# Altium footprint library BARKO_PCBLIB.PcbLib: 531 footprints (part 12 of 34)
Each footprint in its own frame and in the unit in brackets; x right, y up, seen from the top. Pads: shape width x height; smd on the part's side, far side on the other; paste and mask are expansions set on the pad; w line width, h text height; cw(c..) or ccw(c..) is an arc to the next point about the centre after c.
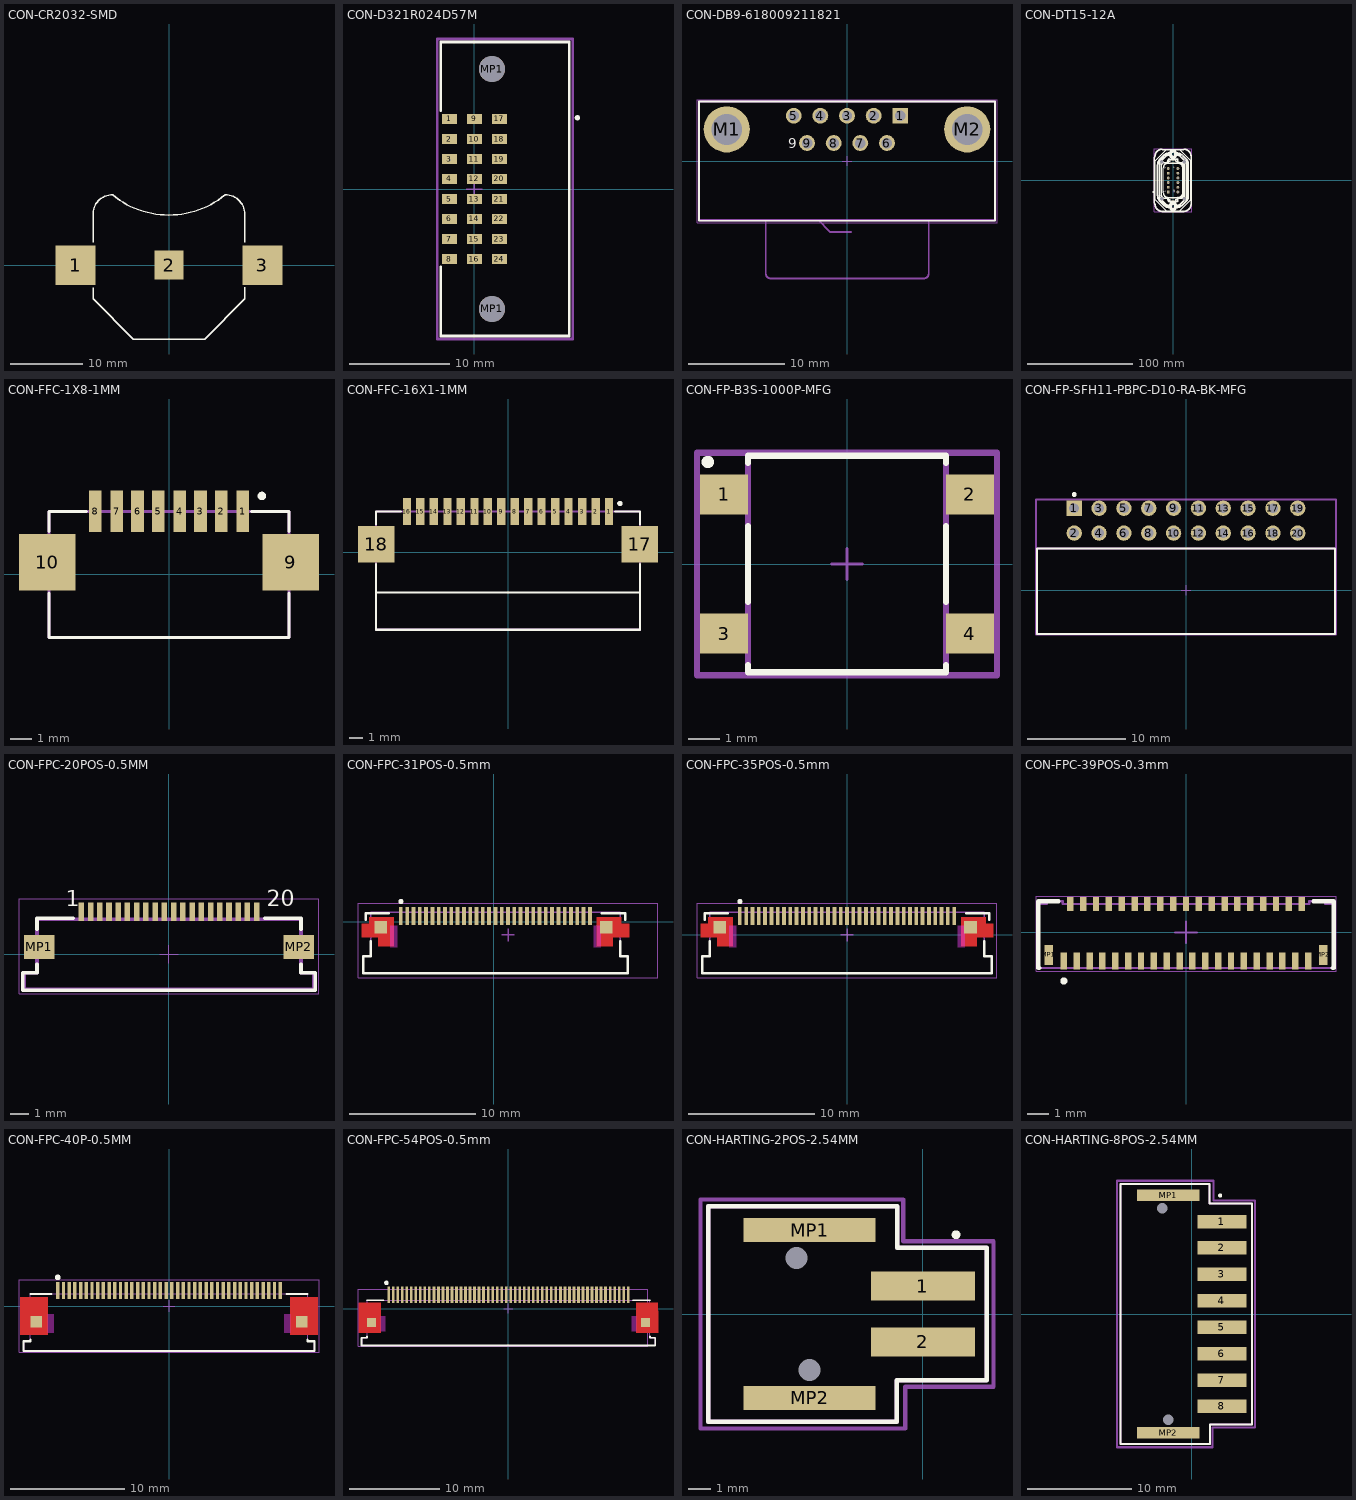
[diagram p11: the footprints below, top view; thin cyan lines are the x and y axes]

## CON-CR2032-SMD [mm] "COIN HOLDER"
pads (3):
  rect 5.5x5.5 smd: 1(-13,0) 3(13,0)
  rect 4x4 smd: 2(0,0)
Top Overlay:
  lines w0.2: -10.541,3.17 -10.541,7.272 -10.54,7.273 -10.54,7.255 ; -10.541,7.239 cw(c-7.925,7.162) -7.848,9.779 ccw(c-0.024,19.196) 7.8,9.779 cw(c7.822,7.06) 10.541,7.081 ; -10.54,-3.12 -10.541,-3.119 -10.541,-3.121 -10.541,-4.712 -4.978,-10.275 4.978,-10.275 10.541,-4.712 10.541,-3.101 ; 10.541,3.201 10.541,7.185
ASM Top:
  text ".designator" at -2,0.003 h0.8
3D body "User Library-3002.step": height 3.98, standoff 0.01, extent -15.367,-10.274 15.367,9.779

## CON-D321R024D57M [mm]
pads (26):
  rect 1.5x1 smd mask+0.05: 1(-2.5,7) 2(-2.5,5) 3(-2.5,3) 4(-2.5,1) 5(-2.5,-1) 6(-2.5,-3) 7(-2.5,-5) 8(-2.5,-7) 9(0,7) 10(0,5) 11(0,3) 12(0,1) 13(0,-1) 14(0,-3) 15(0,-5) 16(0,-7) 17(2.5,7) 18(2.5,5) 19(2.5,3) 20(2.5,1) 21(2.5,-1) 22(2.5,-3) 23(2.5,-5) 24(2.5,-7)
  round 2.6 hole 2.6 unplated: MP1(1.75,-12) MP1(1.75,12)
Top Overlay:
  circle w0.3: c10.3,7.125 r0.12
  lines w0.254: -3.375,-7.8 -3.375,-14.7 9.475,-14.7 9.475,14.7 -3.375,14.7 -3.375,7.85
Mechanical 15:
  lines w0.15: -0.8,0 0,0 ; 0,-0.8 0,0 ; 0,0.8 0,0 ; 0.8,0 0,0
  lines w0.254: -3.7,-15 9.85,-15 9.85,15 -3.7,15 -3.7,-15
3D body "D321R024D57M.STEP": height 8.6, standoff -6.55, extent -3.184,-14.5 9.29,14.5

## CON-DB9-618009211821 [mm] "09p 8.08mm bracket, board lock & UNC4-40 Rivet without hex screw"
height 12.5
pads (11):
  rect 1.65x1.65 hole 1.09: 1(5.54,4.72)
  round 1.65 hole 1.09: 2(2.77,4.72) 3(0,4.72) 4(-2.77,4.72) 5(-5.54,4.72) 6(4.155,1.88) 7(1.385,1.88) 8(-1.385,1.88) 9(-4.155,1.88)
  round 4.8 hole 3.2: M1(-12.5,3.3) M2(12.5,3.3)
Top Overlay:
  lines w0.2: -15.4,-6.2 -15.4,6.2 15.4,6.2 15.4,-6.2 -15.4,-6.2
  text "9" at -6.1,1.35 h1.02
Dimensions:
  lines w0.2: -15.4,-6.12 15.4,-6.12 ; -3,-6.12 -1.77,-7.35 0.4,-7.35
  text "PCB Edge" at 0.7,-8.05 h1.02
Mechanical 15:
  lines w0.05: -0.5,0 0.5,0 ; 0,-0.5 0,0.5 ; -15.6,-6.4 15.6,-6.4 15.6,6.4 -15.6,6.4 -15.6,-6.4
ASM Top:
  lines w0.2: -8.45,-6.2 -8.45,-11.7 ccw(c-7.95,-11.7) -7.95,-12.2 ; -8,-12.2 8,-12.2 ccw(c8,-11.7) 8.5,-11.7 8.5,-6.2 ; -15.4,-6.2 -15.4,6.2 15.4,6.2 15.4,-6.2 -15.4,-6.2
  text ".designator" at 0,0.115 h0.8
3D body "618009211821.stp": height 12.55, standoff -3.95, extent -15.4,-12.2 15.4,6.2

## CON-DT15-12A [mm] "12 Position 4.44mm"
height 3.12
pads (16):
  rect 2.7x2.7 hole 1.77: 1(-4.56,-11.115)
  round 2.7 hole 1.77: 2(-4.56,-6.67) 3(-4.56,-2.225) 4(-4.56,2.225) 5(-4.56,6.67) 6(-4.56,11.115) 7(4.56,11.115) 8(4.56,6.67) 9(4.56,2.225) 10(4.56,-2.225) 11(4.56,-6.67) 12(4.56,-11.115)
  round 3 hole 3 unplated: ""(-10.67,-17.545) ""(-10.67,17.535) ""(10.67,-17.545) ""(10.67,17.535)
Top Overlay:
  drawing of 420 lines, arcs and shapes, not listed
  text "7" at 2.7,11.2 h2
  text "6" at -6.6,11 h2
  text "1" at -6.5,-11.3 h2
  text "12" at 2.7,-11.6 h2
Mechanical 15:
  lines w0.2: -17.9,-29.9 -17.9,29.9 17.9,29.9 17.9,-29.9 -17.9,-29.9
ASM Top:
  lines w0.2: -17.627,-21.986 ccw(c-10.007,-21.986) -10.007,-29.606 10.008,-29.606 ccw(c10.008,-21.986) 17.628,-21.986 17.628,21.981 ccw(c10.008,21.981) 10.008,29.601 -10.007,29.601 ccw(c-10.007,21.981) -17.627,21.981 -17.627,-21.986
  text ".designator" at -1.5,-0.2 h0.8
3D body "c-dt15-12pa-e-3d.stp": height 30.14, standoff -3.09, extent -17.628,-29.604 17.628,29.604

## CON-FFC-1X8-1MM [mil]
pads (10):
  rect 24x78 smd mask+2: 1(138,118) 2(98,118) 3(59,118) 4(20,118) 5(-20,118) 6(-59,118) 7(-98,118) 8(-138,118)
  rect 106x106 smd mask+2: 9(228,23) 10(-228,23)
Top Overlay:
  circle w7.87: c174,147 r3.94
  lines w6: -225,-35 -225,-118 225,-118 225,-35 ; -225,81 -225,118 -155,118 ; 155,118 225,118 225,81
ASM Top:
  lines w6: -225,-118 -225,118 225,118 225,-118 -225,-118
  text ".designator" at -209,-65 h31.5
3D body "8 way 1mm.stp": height 81.37, standoff -1.48, extent -248.1,-110 247.99,141.97

## CON-FFC-16X1-1MM [mil]
pads (18):
  rect 24x78 smd mask+2: 1(295,118) 2(256,118) 3(217,118) 4(177,118) 5(138,118) 6(98,118) 7(59,118) 8(20,118) 9(-20,118) 10(-59,118) 11(-98,118) 12(-138,118) 13(-177,118) 14(-217,118) 15(-256,118) 16(-295,118)
  rect 106x106 smd mask+2: 17(385,23) 18(-385,23)
Top Overlay:
  circle w7.87: c326.77,141.73 r3.94
  lines w6: -385,-118 385,-118 ; -385,-35 -385,-227 385,-227 385,-35 ; -385,81 -385,118 -312,118 ; 312,118 385,118 385,81
ASM Top:
  lines w6: -385,-227 -385,118 385,118 385,-227 -385,-227
  text ".designator" at -295,-27 h31.5
3D body "16 way 1mm.stp": height 81.48, standoff -1.48, extent -406.06,-115 405,136.97

## CON-FP-B3S-1000P-MFG [mm]
pads (4):
  rect 1.55x1.3 smd paste+0 mask+0: 1(-3.975,2.25) 2(3.975,2.25) 3(-3.975,-2.25) 4(3.975,-2.25)
Top Overlay:
  circle w0.2: c-4.5,3.3 r0.1
  lines w0.2: -3.2,-3.275 -3.2,-3.5 3.2,-3.5 3.2,-3.275 ; -3.2,-1.225 -3.2,1.225 ; -3.2,3.275 -3.2,3.5 3.2,3.5 3.2,3.275 ; 3.2,-1.225 3.2,1.225
Mechanical 15:
  lines w0.1: -0.5,0 0.5,0 ; 0,-0.5 0,0.5 ; -4.85,-3.6 4.85,-3.6 4.85,3.6 -4.85,3.6 -4.85,-3.6
ASM Top:
  lines w0.2: -4.85,-3.6 4.85,-3.6 4.85,3.6 -4.85,3.6 -4.85,-3.6 ; -3.2,-3.5 3.2,-3.5 3.2,3.5 -3.2,3.5 -3.2,-3.5
  text ".designator" at 0,0.188 h1
3D body "Switch_Omron_Electronics_Inc-EMC_Div_B3S-1000P_eec.STEP": height 4.7, standoff 0, extent -4.5,-3.3 4.5,3.3

## CON-FP-SFH11-PBPC-D10-RA-BK-MFG [mm]
pads (20):
  rect 1.57x1.57 hole 1.02 paste-1000 mask+0: 1(-11.43,8.39)
  round 1.57 hole 1.02 paste-1000 mask+0: 2(-11.43,5.85) 3(-8.89,8.39) 4(-8.89,5.85) 5(-6.35,8.39) 6(-6.35,5.85) 7(-3.81,8.39) 8(-3.81,5.85) 9(-1.27,8.39) 10(-1.27,5.85) 11(1.27,8.39) 12(1.27,5.85) 13(3.81,8.39) 14(3.81,5.85) 15(6.35,8.39) 16(6.35,5.85) 17(8.89,8.39) 18(8.89,5.85) 19(11.43,8.39) 20(11.43,5.85)
Top Overlay:
  circle w0.25: c-11.43,9.8 r0.125
  lines w0.2: -15.24,-4.45 -15.24,4.25 15.24,4.25 15.24,-4.45 -15.24,-4.45
Mechanical 13:
  lines w0.2: -15.24,-4.45 -15.24,4.25 15.24,4.25 15.24,-4.45 -15.24,-4.45
Mechanical 15:
  lines w0.1: -0.5,0 0.5,0 ; 0,-0.5 0,0.5
  lines w0.2: -15.34,-4.55 -15.34,9.275 15.34,9.275 15.34,-4.55 -15.34,-4.55
ASM Top:
  lines w0.2: -15.34,-4.55 -15.34,9.275 15.34,9.275 15.34,-4.55 -15.34,-4.55
  text ".designator" at 0,2.551 h1
3D body "Conn_Sullins_SFH11-PBPC-D10-RA-BK_eec.STEP": height 7.11, standoff -2.68, extent -15.128,-4.247 15.192,8.593

## CON-FPC-20POS-0.5MM [mm] "ZIF Connectors, Horizontal, Top Contact Low Profile, pitch 0.5mm, 20p"
height 1.3
pads (22):
  rect 0.3x1 smd: 1(-4.75,2.3) 2(-4.25,2.3) 3(-3.75,2.3) 4(-3.25,2.3) 5(-2.75,2.3) 6(-2.25,2.3) 7(-1.75,2.3) 8(-1.25,2.3) 9(-0.75,2.3) 10(-0.25,2.3) 11(0.25,2.3) 12(0.75,2.3) 13(1.25,2.3) 14(1.75,2.3) 15(2.25,2.3) 16(2.75,2.3) 17(3.25,2.3) 18(3.75,2.3) 19(4.25,2.3) 20(4.75,2.3)
  rect 1.65x1.3 smd: MP1(-7.025,0.4) MP2(7.025,0.4)
Top Overlay:
  lines w0.2: -7.15,-0.55 -7.15,-1 -7.925,-1 -7.925,-1.95 7.925,-1.95 7.925,-1 7.15,-1 7.15,-0.55 ; -7.15,1.35 -7.15,1.95 -5.2,1.95 ; 5.2,1.95 7.15,1.95 7.15,1.35
  text "20" at 5.3,2.3 h1.5
  text "1" at -5.6,2.3 h1.5
Mechanical 15:
  lines w0.05: -0.5,0 0.5,0 ; 0,-0.5 0,0.5 ; -8.125,-2.15 8.125,-2.15 8.125,3 -8.125,3 -8.125,-2.15
ASM Top:
  lines w0.2: -7.85,-1.9 -7.85,-1 -7.15,-1 -7.15,1.9 7.15,1.9 7.15,-1 7.85,-1 7.85,-1.9 -7.85,-1.9
  text ".designator" at -0.6,0 h0.8
3D body "687120183622.stp": height 1.28, standoff -0.01, extent -7.85,-1.9 7.85,2.35

## CON-FPC-31POS-0.5mm [mm] "FPC Connector, 31-Leads, Right Angle, Pitch 0.5 mm, Mated Height 2.0 mm, SMT"
height 1.9
pads (33):
  rect 0.3x1.4 smd: 1(-7.35,0.45) 2(-6.85,0.45) 3(-6.35,0.45) 4(-5.85,0.45) 5(-5.35,0.45) 6(-4.85,0.45) 7(-4.35,0.45) 8(-3.85,0.45) 9(-3.35,0.45) 10(-2.85,0.45) 11(-2.35,0.45) 12(-1.85,0.45) 13(-1.35,0.45) 14(-0.85,0.45) 15(-0.35,0.45) 16(0.15,0.45) 17(0.65,0.45) 18(1.15,0.45) 19(1.65,0.45) 20(2.15,0.45) 21(2.65,0.45) 22(3.15,0.45) 23(3.65,0.45) 24(4.15,0.45) 25(4.65,0.45) 26(5.15,0.45) 27(5.65,0.45) 28(6.15,0.45) 29(6.65,0.45) 30(7.15,0.45) 31(7.65,0.45)
  rect 1x1 smd: MP1(-8.95,-0.45) MP2(8.95,-0.45)
Top Layer:
  region: -7.9,-1.95 -9.15,-1.95 -9.15,-1.25 -10.45,-1.25 -10.45,-0.15 -9.85,-0.15 -9.85,0.35 -7.9,0.35
  region: 8.2,-1.95 9.45,-1.95 9.45,-1.25 10.75,-1.25 10.75,-0.15 10.15,-0.15 10.15,0.35 8.2,0.35
Top Overlay:
  circle w0.2: c-7.35,1.6 r0.1
  lines w0.2: -10.15,0.15 -10.15,0.65 -8.3,0.65 ; -9.75,-1.55 -9.75,-2.75 -10.35,-2.75 -10.35,-4.1 10.65,-4.1 10.65,-2.75 10.05,-2.75 10.05,-1.55 ; 8.599,0.65 10.449,0.65 10.449,0.15
Keep-Out Layer:
  region: -7.65,-0.339 -8.2,-0.339 -8.2,-2.039 -7.65,-2.039
  region: 8.493,-0.339 7.943,-0.339 7.943,-2.039 8.493,-2.039
Mechanical 15:
  lines w0.05: -10.75,-4.45 13.05,-4.45 13.05,1.45 -10.75,1.45 -10.75,-4.45
  lines w0.1: 0.65,-1.05 1.65,-1.05 ; 1.15,-1.55 1.15,-0.55
ASM Top:
  lines w0.1: -10.35,-4.05 -10.35,-2.75 -9.75,-2.75 -9.75,0.728 10.05,0.728 10.05,-2.75 10.65,-2.75 10.65,-4.05 -10.35,-4.05
  text ".designator" at -1.15,-1.55 h0.8
3D body "ssfv31r_4stlf.stp": height 1.88, standoff 0.01, extent -10.35,-4.15 10.65,0.75

## CON-FPC-35POS-0.5mm [mm] "FPC Connector, 35-Leads, Right Angle, Pitch 0.5 mm, Mated Height 2.0 mm, SMT"
height 1.9
pads (37):
  rect 0.3x1.4 smd: 1(-8.5,1.5) 2(-8,1.5) 3(-7.5,1.5) 4(-7,1.5) 5(-6.5,1.5) 6(-6,1.5) 7(-5.5,1.5) 8(-5,1.5) 9(-4.5,1.5) 10(-4,1.5) 11(-3.5,1.5) 12(-3,1.5) 13(-2.5,1.5) 14(-2,1.5) 15(-1.5,1.5) 16(-1,1.5) 17(-0.5,1.5) 18(0,1.5) 19(0.5,1.5) 20(1,1.5) 21(1.5,1.5) 22(2,1.5) 23(2.5,1.5) 24(3,1.5) 25(3.5,1.5) 26(4,1.5) 27(4.5,1.5) 28(5,1.5) 29(5.5,1.5) 30(6,1.5) 31(6.5,1.5) 32(7,1.5) 33(7.5,1.5) 34(8,1.5) 35(8.5,1.5)
  rect 1x1 smd: MP1(-10.1,0.6) MP2(9.8,0.6)
Top Layer:
  region: -9.05,-0.9 -10.3,-0.9 -10.3,-0.2 -11.6,-0.2 -11.6,0.9 -11,0.9 -11,1.4 -9.05,1.4
  region: 9.05,-0.9 10.3,-0.9 10.3,-0.2 11.6,-0.2 11.6,0.9 11,0.9 11,1.4 9.05,1.4
Top Overlay:
  circle w0.2: c-8.5,2.65 r0.1
  lines w0.2: -11.5,-3.05 11.5,-3.05 11.5,-1.7 10.9,-1.7 10.9,-0.5 ; -11.5,-3.05 -11.5,-1.7 -10.9,-1.7 -10.9,-0.5 ; -11.3,1.2 -11.3,1.7 -9.45,1.7 ; 9.45,1.7 11.3,1.7 11.3,1.2
Keep-Out Layer:
  region: 9.343,0.711 8.793,0.711 8.793,-0.989 9.343,-0.989
  region: -8.8,0.711 -9.35,0.711 -9.35,-0.989 -8.8,-0.989
Mechanical 15:
  lines w0.05: -11.9,-3.4 11.9,-3.4 11.9,2.5 -11.9,2.5 -11.9,-3.4
  lines w0.1: -0.5,0 0.5,0 ; 0,-0.5 0,0.5
ASM Top:
  lines w0.1: -11.5,-3 -11.5,-1.7 -10.9,-1.7 -10.9,1.778 10.9,1.778 10.9,-1.7 11.5,-1.7 11.5,-3 -11.5,-3
  text ".designator" at -0.6,-0.2 h0.8
3D body "ssfv35r_2stlf.stp": height 1.88, standoff 0.01, extent -11.5,-3.122 11.5,1.778

## CON-FPC-39POS-0.3mm [mm] "FPC Connector, 39-Leads, Right Angle, Pitch 0.3 mm, Mated Height 0.9 mm, SMT"
height 0.912
pads (41):
  rect 0.3x0.8 smd mask+0.05: 1(-5.7,-1.325) 3(-5.1,-1.325) 5(-4.5,-1.325) 7(-3.9,-1.325) 9(-3.3,-1.325) 11(-2.7,-1.325) 13(-2.1,-1.325) 15(-1.5,-1.325) 17(-0.9,-1.325) 19(-0.3,-1.325) 21(0.3,-1.325) 23(0.9,-1.325) 25(1.5,-1.325) 27(2.1,-1.325) 29(2.7,-1.325) 31(3.3,-1.325) 33(3.9,-1.325) 35(4.5,-1.325) 37(5.1,-1.325) 39(5.7,-1.325)
  rect 0.3x0.65 smd mask+0.05: 2(-5.4,1.325) 4(-4.8,1.325) 6(-4.2,1.325) 8(-3.6,1.325) 10(-3,1.325) 12(-2.4,1.325) 14(-1.8,1.325) 16(-1.2,1.325) 18(-0.6,1.325) 20(0,1.325) 22(0.6,1.325) 24(1.2,1.325) 26(1.8,1.325) 28(2.4,1.325) 30(3,1.325) 32(3.6,1.325) 34(4.2,1.325) 36(4.8,1.325) 38(5.4,1.325)
  rect 0.4x0.95 smd mask+0.05: MP1(-6.4,-1.05) MP2(6.4,-1.05)
Top Overlay:
  circle w0.25: c-5.7,-2.26 r0.04
  lines w0.2: -6.85,-1.655 -6.9,-1.655 -6.9,1.455 -5.95,1.455 ; 5.95,1.455 6.9,1.455 6.9,-1.655 6.85,-1.655 ; -6.5,1.455 -6.5,1.455
Mechanical 15:
  lines w0.05: -7,-1.81 7,-1.81 7,1.69 -7,1.69 -7,-1.81
  lines w0.1: -0.5,0 0.5,0 ; 0,-0.5 0,0.5
ASM Top:
  lines w0.1: -6.9,-1.655 -6.6,-1.655 6.6,-1.655 6.9,-1.655 6.9,1.325 6.5,1.325 6.5,1.455 5.75,1.455 5.75,1.325 -5.75,1.325 -5.75,1.455 -6.5,1.455 -6.5,1.325 -6.9,1.325 -6.9,-1.655
  text ".designator" at 0,0 h1.2
3D body "s10061122-391420hlf.stp": height 0.91, standoff 0.01, extent -6.75,-1.925 6.75,1.575

## CON-FPC-40P-0.5MM [mm] "FPC Connector, 40-Leads, Right Angle, Pitch 0.5 mm, Mated Height 2.0 mm, SMT"
height 2.002
pads (42):
  rect 0.3x1.5 smd mask+0.05: 1(-9.75,1.375) 2(-9.25,1.375) 3(-8.75,1.375) 4(-8.25,1.375) 5(-7.75,1.375) 6(-7.25,1.375) 7(-6.75,1.375) 8(-6.25,1.375) 9(-5.75,1.375) 10(-5.25,1.375) 11(-4.75,1.375) 12(-4.25,1.375) 13(-3.75,1.375) 14(-3.25,1.375) 15(-2.75,1.375) 16(-2.25,1.375) 17(-1.75,1.375) 18(-1.25,1.375) 19(-0.75,1.375) 20(-0.25,1.375) 21(0.25,1.375) 22(0.75,1.375) 23(1.25,1.375) 24(1.75,1.375) 25(2.25,1.375) 26(2.75,1.375) 27(3.25,1.375) 28(3.75,1.375) 29(4.25,1.375) 30(4.75,1.375) 31(5.25,1.375) 32(5.75,1.375) 33(6.25,1.375) 34(6.75,1.375) 35(7.25,1.375) 36(7.75,1.375) 37(8.25,1.375) 38(8.75,1.375) 39(9.25,1.375) 40(9.75,1.375)
  rect 1x1 smd paste-10 mask+0.05: MP1(-11.65,-1.375) MP2(11.65,-1.375)
Top Layer:
  region: -10.65,0.8 -13.05,0.8 -13.05,-0.925 -13.05,-2.525 -10.65,-2.525
  region: 10.65,0.8 13.05,0.8 13.05,-0.925 13.05,-2.525 10.65,-2.525
Top Overlay:
  circle w0.25: c-9.75,2.525 r0.125
  lines w0.2: -12.15,-2.925 -12.15,-3.075 -12.75,-3.075 -12.75,-3.925 12.75,-3.925 12.75,-3.075 12.15,-3.075 12.15,-2.925 ; -12.15,1.075 -10.3,1.075 ; 10.3,1.075 12.15,1.075
Top Paste:
  region: 11.7,-1.1 10.9,-1.1 10.9,-2.2 11.7,-2.2
  rectangle: 12.1,-0.5 12.9,0.6
  rectangle: 12.1,-2.2 12.9,-1.1
  region: 11.7,0.6 10.9,0.6 10.9,-0.5 11.7,-0.5
  rectangle: -11.7,-0.5 -10.9,0.6
  region: -12.1,-1.1 -12.9,-1.1 -12.9,-2.2 -12.1,-2.2
  region: -12.1,0.6 -12.9,0.6 -12.9,-0.5 -12.1,-0.5
  rectangle: -11.7,-2.2 -10.9,-1.1
Keep-Out Layer:
  region: -10.1,-0.675 -10.65,-0.675 -10.65,-2.375 -10.1,-2.375
  rectangle: 10.1,-2.375 10.65,-0.675
Mechanical 15:
  lines w0.05: -13.15,-4.025 -13.15,2.3 13.15,2.3 13.15,-4.025 -13.15,-4.025
  lines w0.1: -0.5,0 0.5,0 ; 0,-0.5 0,0.5
ASM Top:
  lines w0.1: -12.75,-3.925 12.75,-3.925 12.75,-3.075 12.15,-3.075 12.15,1.075 -12.15,1.075 -12.15,-3.075 -12.75,-3.075 -12.75,-3.925
  text ".designator" at -0.8,-1.6 h0.8
3D body "541324062.stp": height 2.01, standoff 0.01, extent -12.75,-3.925 12.75,1.675

## CON-FPC-54POS-0.5mm [mm] "FPC Connector, 35-Leads, Right Angle, Pitch 0.5 mm, Mated Height 2.0 mm, SMT"
height 1.9
pads (56):
  rect 0.3x1.8 smd mask+0.05: 1(-13.25,1.525) 2(-12.75,1.525) 3(-12.25,1.525) 4(-11.75,1.525) 5(-11.25,1.525) 6(-10.75,1.525) 7(-10.25,1.525) 8(-9.75,1.525) 9(-9.25,1.525) 10(-8.75,1.525) 11(-8.25,1.525) 12(-7.75,1.525) 13(-7.25,1.525) 14(-6.75,1.525) 15(-6.25,1.525) 16(-5.75,1.525) 17(-5.25,1.525) 18(-4.75,1.525) 19(-4.25,1.525) 20(-3.75,1.525) 21(-3.25,1.525) 22(-2.75,1.525) 23(-2.25,1.525) 24(-1.75,1.525) 25(-1.25,1.525) 26(-0.75,1.525) 27(-0.25,1.525) 28(0.25,1.525) 29(0.75,1.525) 30(1.25,1.525) 31(1.75,1.525) 32(2.25,1.525) 33(2.75,1.525) 34(3.25,1.525) 35(3.75,1.525) 36(4.25,1.525) 37(4.75,1.525) 38(5.25,1.525) 39(5.75,1.525) 40(6.25,1.525) 41(6.75,1.525) 42(7.25,1.525) 43(7.75,1.525) 44(8.25,1.525) 45(8.75,1.525) 46(9.25,1.525) 47(9.75,1.525) 48(10.25,1.525) 49(10.75,1.525) 50(11.25,1.525) 51(11.75,1.525) 52(12.25,1.525) 53(12.75,1.525) 54(13.25,1.525)
  rect 1x1 smd paste-10 mask+0.05: MP1(-15.15,-1.525) MP2(15.15,-1.525)
Top Layer:
  region: 14.15,0.65 16.55,0.65 16.55,-1.075 16.55,-2.675 14.15,-2.675
  region: -14.15,0.65 -16.55,0.65 -16.55,-1.075 -16.55,-2.675 -14.15,-2.675
Top Overlay:
  circle w0.25: c-13.5,2.85 r0.125
  lines w0.2: -15.65,-3.075 -15.65,-3.225 -16.25,-3.225 -16.25,-4.075 16.25,-4.075 16.25,-3.225 15.65,-3.225 15.65,-3.075 ; -15.65,0.925 -13.8,0.925 ; 13.8,0.925 15.65,0.925
Top Paste:
  rectangle: 15.6,-0.65 16.4,0.45
  rectangle: 15.6,-2.35 16.4,-1.25
  region: 15.2,-1.25 14.4,-1.25 14.4,-2.35 15.2,-2.35
  region: 15.2,0.45 14.4,0.45 14.4,-0.65 15.2,-0.65
  rectangle: -15.2,-2.35 -14.4,-1.25
  region: -15.6,0.45 -16.4,0.45 -16.4,-0.65 -15.6,-0.65
  region: -15.6,-1.25 -16.4,-1.25 -16.4,-2.35 -15.6,-2.35
  rectangle: -15.2,-0.65 -14.4,0.45
Keep-Out Layer:
  rectangle: 13.6,-2.525 14.15,-0.825
  region: -13.6,-0.825 -14.15,-0.825 -14.15,-2.525 -13.6,-2.525
Mechanical 15:
  lines w0.05: -16.65,-4.175 15.4,-4.175 15.4,2.15 -16.65,2.15 -16.65,-4.175
  lines w0.1: -0.5,0.008 0.5,0.008 ; 0,-0.492 0,0.508
ASM Top:
  lines w0.1: -16.25,-4.075 -16.25,-3.225 -15.65,-3.225 -15.65,0.925 15.65,0.925 15.65,-3.225 16.25,-3.225 16.25,-4.075 -16.25,-4.075
  text ".designator" at -0.2,-0.9 h0.8
3D body "f32r_54pin_asm.stp": height 2.11, standoff 0.01, extent -17.15,-4 17.15,1.5

## CON-HARTING-2POS-2.54MM [mm]
height 5
pads (6):
  rect 4.7x1.3 smd: 1(0,1.27) 2(0,-1.27)
  rect 6x1.1 smd: MP1(-5.15,3.81) MP2(-5.15,-3.81)
  rect 0x0 hole 1 unplated: MP3(-5.15,-2.54) MP4(-5.75,2.54)
Top Overlay:
  circle w0.2: c1.5,3.6 r0.1
  lines w0.2: -9.75,-4.9 -9.75,4.9 -1.16,4.9 -1.16,3 2.9,3 2.9,-3 -1.2,-3 -1.2,-4.9 -9.75,-4.9
Mechanical 15:
  lines w0.2: -10.1,-5.2 -0.8,-5.2 -0.8,-3.3 2.2,-3.3 3.2,-3.3 3.2,3.3 -0.9,3.3 -0.9,5.2 -10.1,5.2 -10.1,-5.2
ASM Top:
  lines w0.2: -9.75,-4.9 -1.2,-4.9 -1.2,-3 2.5,-3 2.9,-3 2.9,3 -1.16,3 -1.16,4.9 -9.75,4.9 -9.75,-4.9
  text ".designator" at -1.2,-0.2 h0.8
3D body "14010213102000_100538979MOD000A.STP": height 4.91, standoff -0.99, extent -9.75,-4.885 1.8,4.885

## CON-HARTING-8POS-2.54MM [mm]
height 5
pads (12):
  rect 4.7x1.3 smd: 1(2.875,8.89) 2(2.875,6.35) 3(2.875,3.81) 4(2.875,1.27) 5(2.875,-1.27) 6(2.875,-3.81) 7(2.875,-6.35) 8(2.875,-8.89)
  rect 6x1.1 smd: MP1(-2.275,11.43) MP2(-2.275,-11.43)
  rect 0x0 hole 1 unplated: MP3(-2.275,-10.16) MP4(-2.875,10.16)
Top Overlay:
  circle w0.2: c2.7,11.4 r0.1
  lines w0.2: -6.875,-3.054 -6.875,12.52 1.675,12.52 1.675,10.62 5.764,10.62 ; -6.875,-2.72 -6.875,-12.52 1.715,-12.52 1.715,-10.62 5.775,-10.62 5.775,-4.62 ; 5.775,-4.641 5.775,10.62
Mechanical 15:
  lines w0.2: -7.225,-2.566 -7.225,12.82 2.075,12.82 2.075,10.92 5.075,10.92 6.075,10.92 6.075,-4.16 6.075,-4.507 ; -7.225,-2.42 -7.225,-12.82 1.975,-12.82 1.975,-10.92 6.075,-10.92 6.075,-4.32
ASM Top:
  lines w0.2: -6.875,-12.52 -6.875,12.52 1.675,12.52 1.675,10.62 5.375,10.62 5.775,10.62 5.775,-10.62 1.715,-10.62 1.715,-12.52 -6.875,-12.52
  text ".designator" at -1.2,-0.2 h0.8
3D body "14010813102000_100540070MOD000A.STP": height 5.01, standoff -0.89, extent -6.85,-12.505 4.7,12.505